# Altium footprint library IntLib.PcbLib: 221 footprints (part 14 of 14)
Each footprint in its own frame and in the unit in brackets; x right, y up, seen from the top. Pads: shape width x height; smd on the part's side, far side on the other; paste and mask are expansions set on the pad; w line width, h text height; cw(c..) or ccw(c..) is an arc to the next point about the centre after c.
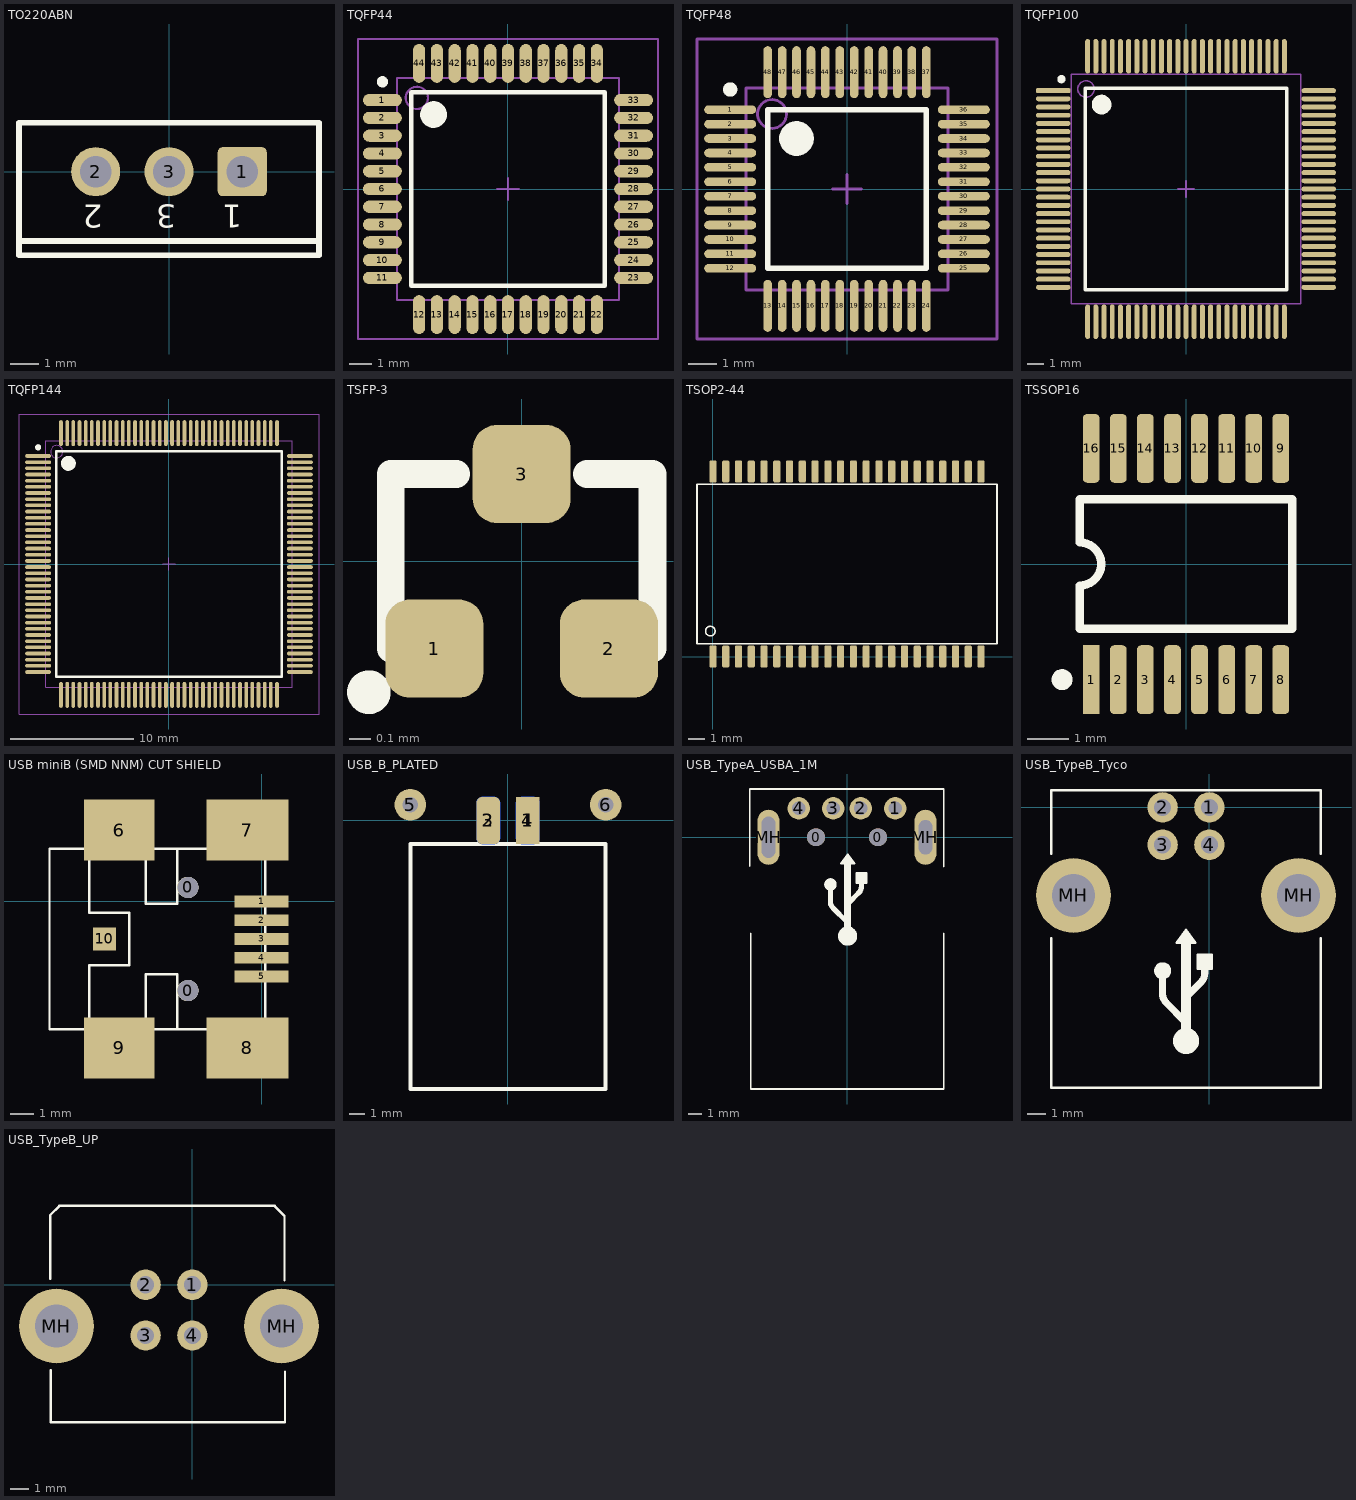
[diagram p13: the footprints below, top view; thin cyan lines are the x and y axes]

## TO220ABN [mm] "TO, Thru-Hole, Vertical, Heatsink Mounted; 3 In-Line Leads; Pitch 2.54 mm; Pin sequence 1, 3, 2"
height 19.7
pads (3):
  rrect20% 1.7x1.7 hole 1.1: 1(2.54,0)
  round 1.7 hole 1.1: 2(-2.54,0) 3(0,0)
Top Overlay:
  lines w0.2: -5.2,-2.4 5.2,-2.4 ; -5.2,-2.9 5.2,-2.9 5.2,1.7 -5.2,1.7 -5.2,-2.9
  text "3" at 0.246,-1.151 h0.8
  text "2" at -2.294,-1.151 h0.8
  text "1" at 2.536,-1.151 h0.8
3D body: height 18.74, standoff -10.04, extent -5.08,-2.921 5.08,1.651

## TQFP44 [mm] "44-Pin Plastic Thin Quad Flat Pack (TFQP44), IPC Medium Density"
height 1.2
pads (44):
  oval 1.75x0.55 smd: 1(-5.65,4) 2(-5.65,3.2) 3(-5.65,2.4) 4(-5.65,1.6) 5(-5.65,0.8) 6(-5.65,0) 7(-5.65,-0.8) 8(-5.65,-1.6) 9(-5.65,-2.4) 10(-5.65,-3.2) 11(-5.65,-4) 23(5.65,-4) 24(5.65,-3.2) 25(5.65,-2.4) 26(5.65,-1.6) 27(5.65,-0.8) 28(5.65,0) 29(5.65,0.8) 30(5.65,1.6) 31(5.65,2.4) 32(5.65,3.2) 33(5.65,4)
  oval 0.55x1.75 smd: 12(-4,-5.65) 13(-3.2,-5.65) 14(-2.4,-5.65) 15(-1.6,-5.65) 16(-0.8,-5.65) 17(0,-5.65) 18(0.8,-5.65) 19(1.6,-5.65) 20(2.4,-5.65) 21(3.2,-5.65) 22(4,-5.65) 34(4,5.65) 35(3.2,5.65) 36(2.4,5.65) 37(1.6,5.65) 38(0.8,5.65) 39(0,5.65) 40(-0.8,5.65) 41(-1.6,5.65) 42(-2.4,5.65) 43(-3.2,5.65) 44(-4,5.65)
Top Overlay:
  circle w0.25: c-5.65,4.825 r0.125
  circle w0.6: c-3.35,3.35 r0.3
  lines w0.2: -4.35,-4.35 -4.35,4.35 4.35,4.35 4.35,-4.35 -4.35,-4.35
Mechanical 13:
  circle w0.1: c-4.1,4.1 r0.5
  lines w0.1: -5,-5 -5,5 5,5 5,-5 -5,-5
Mechanical 15:
  lines w0.1: -0.5,0 0.5,0 ; 0,-0.5 0,0.5 ; -6.75,-6.75 -6.75,6.75 6.75,6.75 6.75,-6.75 -6.75,-6.75
3D body: height 1.2, standoff 0, extent -5,-5 5,5

## TQFP48 [mm] "48-Pin Thin Quad Flat Pack 0.5 mm Pitch, IPC Medium Density"
height 1.6
pads (48):
  oval 1.8x0.3 smd: 1(-4.05,2.75) 2(-4.05,2.25) 3(-4.05,1.75) 4(-4.05,1.25) 5(-4.05,0.75) 6(-4.05,0.25) 7(-4.05,-0.25) 8(-4.05,-0.75) 9(-4.05,-1.25) 10(-4.05,-1.75) 11(-4.05,-2.25) 12(-4.05,-2.75) 25(4.05,-2.75) 26(4.05,-2.25) 27(4.05,-1.75) 28(4.05,-1.25) 29(4.05,-0.75) 30(4.05,-0.25) 31(4.05,0.25) 32(4.05,0.75) 33(4.05,1.25) 34(4.05,1.75) 35(4.05,2.25) 36(4.05,2.75)
  oval 0.3x1.8 smd: 13(-2.75,-4.05) 14(-2.25,-4.05) 15(-1.75,-4.05) 16(-1.25,-4.05) 17(-0.75,-4.05) 18(-0.25,-4.05) 19(0.25,-4.05) 20(0.75,-4.05) 21(1.25,-4.05) 22(1.75,-4.05) 23(2.25,-4.05) 24(2.75,-4.05) 37(2.75,4.05) 38(2.25,4.05) 39(1.75,4.05) 40(1.25,4.05) 41(0.75,4.05) 42(0.25,4.05) 43(-0.25,4.05) 44(-0.75,4.05) 45(-1.25,4.05) 46(-1.75,4.05) 47(-2.25,4.05) 48(-2.75,4.05)
Top Overlay:
  circle w0.25: c-4.05,3.45 r0.125
  circle w0.6: c-1.75,1.75 r0.3
  lines w0.2: -2.75,-2.75 -2.75,2.75 2.75,2.75 2.75,-2.75 -2.75,-2.75
Mechanical 13:
  circle w0.1: c-2.6,2.6 r0.5
  lines w0.1: -3.5,-3.5 -3.5,3.5 3.5,3.5 3.5,-3.5 -3.5,-3.5
Mechanical 15:
  lines w0.1: -0.5,0 0.5,0 ; 0,-0.5 0,0.5 ; -5.2,-5.2 -5.2,5.2 5.2,5.2 5.2,-5.2 -5.2,-5.2
3D body: height 1.6, standoff 0, extent -3.5,-3.5 3.5,3.5

## TQFP100 [mm] "100-Pin Thin Quad Flat Pack 0.5 mm Pitch, IPC Low Density"
height 1.6
pads (100):
  rrect50% 2.1x0.3 smd: 1(-8.1,6)
  oval 2.1x0.3 smd: 2(-8.1,5.5) 3(-8.1,5) 4(-8.1,4.5) 5(-8.1,4) 6(-8.1,3.5) 7(-8.1,3) 8(-8.1,2.5) 9(-8.1,2) 10(-8.1,1.5) 11(-8.1,1) 12(-8.1,0.5) 13(-8.1,0) 14(-8.1,-0.5) 15(-8.1,-1) 16(-8.1,-1.5) 17(-8.1,-2) 18(-8.1,-2.5) 19(-8.1,-3) 20(-8.1,-3.5) 21(-8.1,-4) 22(-8.1,-4.5) 23(-8.1,-5) 24(-8.1,-5.5) 25(-8.1,-6) 51(8.1,-6) 52(8.1,-5.5) 53(8.1,-5) 54(8.1,-4.5) 55(8.1,-4) 56(8.1,-3.5) 57(8.1,-3) 58(8.1,-2.5) 59(8.1,-2) 60(8.1,-1.5) 61(8.1,-1) 62(8.1,-0.5) 63(8.1,0) 64(8.1,0.5) 65(8.1,1) 66(8.1,1.5) 67(8.1,2) 68(8.1,2.5) 69(8.1,3) 70(8.1,3.5) 71(8.1,4) 72(8.1,4.5) 73(8.1,5) 74(8.1,5.5) 75(8.1,6)
  oval 0.3x2.1 smd: 26(-6,-8.1) 27(-5.5,-8.1) 28(-5,-8.1) 29(-4.5,-8.1) 30(-4,-8.1) 31(-3.5,-8.1) 32(-3,-8.1) 33(-2.5,-8.1) 34(-2,-8.1) 35(-1.5,-8.1) 36(-1,-8.1) 37(-0.5,-8.1) 38(0,-8.1) 39(0.5,-8.1) 40(1,-8.1) 41(1.5,-8.1) 42(2,-8.1) 43(2.5,-8.1) 44(3,-8.1) 45(3.5,-8.1) 46(4,-8.1) 47(4.5,-8.1) 48(5,-8.1) 49(5.5,-8.1) 50(6,-8.1) 76(6,8.1) 77(5.5,8.1) 78(5,8.1) 79(4.5,8.1) 80(4,8.1) 81(3.5,8.1) 82(3,8.1) 83(2.5,8.1) 84(2,8.1) 85(1.5,8.1) 86(1,8.1) 87(0.5,8.1) 88(0,8.1) 89(-0.5,8.1) 90(-1,8.1) 91(-1.5,8.1) 92(-2,8.1) 93(-2.5,8.1) 94(-3,8.1) 95(-3.5,8.1) 96(-4,8.1) 97(-4.5,8.1) 98(-5,8.1) 99(-5.5,8.1) 100(-6,8.1)
Top Overlay:
  circle w0.25: c-7.6,6.7 r0.125
  circle w0.6: c-5.15,5.15 r0.3
  lines w0.2: -6.15,-6.15 -6.15,6.15 6.15,6.15 6.15,-6.15 -6.15,-6.15
Mechanical 13:
  circle w0.1: c-6.1,6.1 r0.5
  lines w0.1: -7,-7 -7,7 7,7 7,-7 -7,-7
Mechanical 15:
  lines w0.1: -0.5,0 0.5,0 ; 0,-0.5 0,0.5
3D body: height 1.61, standoff -0.01, extent -8.001,-7.999 7.999,8.001

## TQFP144 [mm] "144-Pin Plastic Thin Quad Flat Pack (TQFP144), IPC Low Density"
height 1.6
pads (144):
  oval 2.1x0.3 smd: 1(-10.6,8.75) 2(-10.6,8.25) 3(-10.6,7.75) 4(-10.6,7.25) 5(-10.6,6.75) 6(-10.6,6.25) 7(-10.6,5.75) 8(-10.6,5.25) 9(-10.6,4.75) 10(-10.6,4.25) 11(-10.6,3.75) 12(-10.6,3.25) 13(-10.6,2.75) 14(-10.6,2.25) 15(-10.6,1.75) 16(-10.6,1.25) 17(-10.6,0.75) 18(-10.6,0.25) 19(-10.6,-0.25) 20(-10.6,-0.75) 21(-10.6,-1.25) 22(-10.6,-1.75) 23(-10.6,-2.25) 24(-10.6,-2.75) 25(-10.6,-3.25) 26(-10.6,-3.75) 27(-10.6,-4.25) 28(-10.6,-4.75) 29(-10.6,-5.25) 30(-10.6,-5.75) 31(-10.6,-6.25) 32(-10.6,-6.75) 33(-10.6,-7.25) 34(-10.6,-7.75) 35(-10.6,-8.25) 36(-10.6,-8.75) 73(10.6,-8.75) 74(10.6,-8.25) 75(10.6,-7.75) 76(10.6,-7.25) 77(10.6,-6.75) 78(10.6,-6.25) 79(10.6,-5.75) 80(10.6,-5.25) 81(10.6,-4.75) 82(10.6,-4.25) 83(10.6,-3.75) 84(10.6,-3.25) 85(10.6,-2.75) 86(10.6,-2.25) 87(10.6,-1.75) 88(10.6,-1.25) 89(10.6,-0.75) 90(10.6,-0.25) 91(10.6,0.25) 92(10.6,0.75) 93(10.6,1.25) 94(10.6,1.75) 95(10.6,2.25) 96(10.6,2.75) 97(10.6,3.25) 98(10.6,3.75) 99(10.6,4.25) 100(10.6,4.75) 101(10.6,5.25) 102(10.6,5.75) 103(10.6,6.25) 104(10.6,6.75) 105(10.6,7.25) 106(10.6,7.75) 107(10.6,8.25) 108(10.6,8.75)
  oval 0.3x2.1 smd: 37(-8.75,-10.6) 38(-8.25,-10.6) 39(-7.75,-10.6) 40(-7.25,-10.6) 41(-6.75,-10.6) 42(-6.25,-10.6) 43(-5.75,-10.6) 44(-5.25,-10.6) 45(-4.75,-10.6) 46(-4.25,-10.6) 47(-3.75,-10.6) 48(-3.25,-10.6) 49(-2.75,-10.6) 50(-2.25,-10.6) 51(-1.75,-10.6) 52(-1.25,-10.6) 53(-0.75,-10.6) 54(-0.25,-10.6) 55(0.25,-10.6) 56(0.75,-10.6) 57(1.25,-10.6) 58(1.75,-10.6) 59(2.25,-10.6) 60(2.75,-10.6) 61(3.25,-10.6) 62(3.75,-10.6) 63(4.25,-10.6) 64(4.75,-10.6) 65(5.25,-10.6) 66(5.75,-10.6) 67(6.25,-10.6) 68(6.75,-10.6) 69(7.25,-10.6) 70(7.75,-10.6) 71(8.25,-10.6) 72(8.75,-10.6) 109(8.75,10.6) 110(8.25,10.6) 111(7.75,10.6) 112(7.25,10.6) 113(6.75,10.6) 114(6.25,10.6) 115(5.75,10.6) 116(5.25,10.6) 117(4.75,10.6) 118(4.25,10.6) 119(3.75,10.6) 120(3.25,10.6) 121(2.75,10.6) 122(2.25,10.6) 123(1.75,10.6) 124(1.25,10.6) 125(0.75,10.6) 126(0.25,10.6) 127(-0.25,10.6) 128(-0.75,10.6) 129(-1.25,10.6) 130(-1.75,10.6) 131(-2.25,10.6) 132(-2.75,10.6) 133(-3.25,10.6) 134(-3.75,10.6) 135(-4.25,10.6) 136(-4.75,10.6) 137(-5.25,10.6) 138(-5.75,10.6) 139(-6.25,10.6) 140(-6.75,10.6) 141(-7.25,10.6) 142(-7.75,10.6) 143(-8.25,10.6) 144(-8.75,10.6)
Top Overlay:
  circle w0.6: c-8.15,8.15 r0.3
  circle w0.25: c-10.6,9.45 r0.125
  lines w0.2: -9.15,-9.15 9.15,-9.15 9.15,9.15 -9.15,9.15 -9.15,-9.15
Mechanical 13:
  circle w0.1: c-9.1,9.1 r0.5
  lines w0.1: -10,-10 10,-10 10,10 -10,10 -10,-10
Mechanical 15:
  lines w0.1: -0.5,0 0.5,0 ; 0,-0.5 0,0.5 ; -12.15,-12.15 12.15,-12.15 12.15,12.15 -12.15,12.15 -12.15,-12.15
3D body: height 1.6, standoff 0, extent -10,-10 10,10

## TSFP-3 [mm] "1.2x1.2mm"
height 1
pads (3):
  rrect50% 0.45x0.45 smd: 1(-0.4,-0.4) 2(0.4,-0.4) 3(0,0.4)
Top Overlay:
  circle w0.1: c-0.7,-0.6 r0.05
  lines w0.127: -0.6,-0.4 -0.6,0.4 -0.3,0.4 ; 0.3,0.4 0.6,0.4 0.6,-0.4

## TSOP2-44 [mm]
pads (44):
  rrect50% 0.45x1.4 smd paste-25.4 mask-25.4: 1(0,0) 2(0.8,0) 3(1.6,0) 4(2.4,0) 5(3.2,0) 6(4,0) 7(4.8,0) 8(5.6,0) 9(6.4,0) 10(7.2,0) 11(8,0) 12(8.8,0) 13(9.6,0) 14(10.4,0) 15(11.2,0) 16(12,0) 17(12.8,0) 18(13.6,0) 19(14.4,0) 20(15.2,0) 21(16,0) 22(16.8,0) 23(16.8,11.6) 24(16,11.6) 25(15.2,11.6) 26(14.4,11.6) 27(13.6,11.6) 28(12.8,11.6) 29(12,11.6) 30(11.2,11.6) 31(10.4,11.6) 32(9.6,11.6) 33(8.8,11.6) 34(8,11.6) 35(7.2,11.6) 36(6.4,11.6) 37(5.6,11.6) 38(4.8,11.6) 39(4,11.6) 40(3.2,11.6) 41(2.4,11.6) 42(1.6,11.6) 43(0.8,11.6) 44(0,11.6)
Top Overlay:
  circle w0.1: c-0.165,1.595 r0.3
  lines w0.1: -1,0.8 -1,10.8 17.8,10.8 17.8,0.8 -1,0.8
Top Paste:
  drawing of 44 lines, arcs and shapes, not listed
Top Solder:
  drawing of 44 lines, arcs and shapes, not listed
3D body: height 1.3, standoff -0.09, extent -0.686,-0.076 17.524,11.684

## TSSOP16 [mm] "Shrink Small Outline; 16 Leads; Body Width 4.4 mm; Pitch 0.65 mm"
height 1.1
pads (16):
  rect 0.4x1.65 smd: 1(-2.275,-2.775)
  rrect50% 0.4x1.65 smd: 2(-1.625,-2.775) 3(-0.975,-2.775) 4(-0.325,-2.775) 5(0.325,-2.775) 6(0.975,-2.775) 7(1.625,-2.775) 8(2.275,-2.775) 9(2.275,2.775) 10(1.625,2.775) 11(0.975,2.775) 12(0.325,2.775) 13(-0.325,2.775) 14(-0.975,2.775) 15(-1.625,2.775) 16(-2.275,2.775)
Top Overlay:
  circle w0.25: c-2.975,-2.775 r0.125
  lines w0.2: -2.55,-1.55 -2.55,-0.517 ccw(c-2.55,0) -2.55,0.517 -2.55,1.55 2.55,1.55 2.55,-1.55 -2.55,-1.55
3D body: height 1.2, standoff 0, extent -2.489,-3.175 2.511,3.225

## USB miniB (SMD NNM) CUT SHIELD [mm]
height 2
pads (12):
  round 0.9 hole 0.9 unplated: 0(-3.145,-3.8) 0(-3.145,0.6)
  rect 2.3x0.5 smd: 1(0,0) 2(0,-0.8) 3(0,-1.6) 4(0,-2.4) 5(0,-3.2)
  rect 3x2.6 smd: 6(-6.075,3.05) 9(-6.075,-6.25)
  rect 3.5x2.6 smd: 7(-0.6,3.05) 8(-0.6,-6.25)
  rect 1x1 smd: 10(-6.7,-1.6)
Top Overlay:
  circle w0.1: c-3.145,-3.8 r0.4
  circle w0.1: c-3.145,0.6 r0.4
  lines w0.1: -7.345,-5.45 -7.345,-2.72 -5.645,-2.72 -5.645,-0.48 -7.345,-0.48 -7.345,2.25 ; -6.845,-5.45 -6.845,-6.55 -5.295,-6.55 -5.295,-5.45 ; -6.845,2.25 -6.845,3.35 -5.295,3.35 -5.295,2.25 ; -4.945,-5.45 -4.945,-3.1 -3.595,-3.1 -3.595,-5.45 ; -4.945,2.25 -4.945,-0.1 -3.595,-0.1 -3.595,2.25 ; -1.395,-5.45 -1.395,-6.55 0.155,-6.55 ; -1.395,2.25 -1.395,3.35 0.155,3.35 ; -1.345,-6.55 0.155,-6.55 ; -1.345,3.35 0.155,3.35 ; 0.155,-6.55 0.155,-5.45 ; 0.155,-5.45 0.155,2.25 ; 0.155,-5.45 -9.045,-5.45 -9.045,2.25 0.155,2.25 ; 0.155,2.25 0.155,3.35
3D body: height 3.9, standoff -1.1, extent -8.989,-6.525 0.406,3.375

## USB_B_PLATED [mm]
pads (6):
  rect 1.5x3 smd: 1(1.25,0)
  rrect50% 1.5x3 smd: 2(-1.25,0)
  rrect50% 1.5x3 smd far side: 3(-1.25,0) 4(1.25,0)
  round 2 / inner rrect50% 2.2x5 / far side rrect50% 2.2x5 hole 1: 5(-6.2,1) 6(6.2,1)
Top Overlay:
  lines w0.254: -6.2,-17.05 -6.2,-1.5 6.2,-1.5 6.2,-17.05 -6.2,-17.05
3D body: height 5, standoff -6, extent -7.494,-17.721 7.545,3.429

## USB_TypeA_USBA_1M [mm]
pads (8):
  round 1.3 hole 1.3 unplated: 0(-2.25,0) 0(2.25,0)
  round 1.626 hole 1: 1(3.5,2.1) 2(1,2.1) 3(-1,2.1) 4(-3.5,2.1)
  oval 1.6x4 hole 1 slot 3 at 90 deg: MH(-5.7,0)
  oval 1.6x4 hole 1 slot 2.5 at 90 deg: MH(5.7,0)
Top Overlay:
  circle w0.508: c-1.205,-3.431 r0.2
  circle w0.889: c0.045,-7.181 r0.254
  region: 1.42,-2.581 1.42,-3.331 0.67,-3.331 0.67,-2.581
  region: 0.045,-1.231 0.545,-1.931 -0.455,-1.931
  lines w0.127: -7.061,-2.083 -7.061,3.505 7.036,3.505 7.036,-2.134 ; -6.985,-6.99 -6.985,-18.288 7.036,-18.288 7.036,-6.99 ; -0.455,-1.931 0.545,-1.931 0.045,-1.231 -0.455,-1.931 ; 0.67,-3.331 1.42,-3.331 1.42,-2.581 0.67,-2.581 0.67,-3.331
  lines w0.381: -1.205,-3.431 -1.205,-4.681 ccw(c-0.564,-4.681) -1.017,-5.134 -0.017,-6.134 ; 0.108,-4.784 0.858,-4.034 ccw(c0.405,-3.581) 1.045,-3.581 1.045,-3.331
  lines w0.508: 0.045,-6.681 0.045,-1.931
3D body: height 4.5, standoff -1.3, extent -6.278,-17.664 6.328,2.261

## USB_TypeB_Tyco [mm]
pads (6):
  round 1.626 hole 0.914: 1(0,0) 2(-2.5,0) 3(-2.5,-2) 4(0,-2)
  round 4 hole 2.3: MH(-7.27,-4.71) MH(4.77,-4.71)
Top Overlay:
  circle w0.889: c-1.25,-12.49 r0.254
  circle w0.508: c-2.5,-8.74 r0.2
  region: -1.25,-6.54 -0.75,-7.24 -1.75,-7.24
  region: 0.125,-7.89 0.125,-8.64 -0.625,-8.64 -0.625,-7.89
  lines w0.127: -8.45,-6.99 -8.45,-14.99 5.95,-14.99 5.95,-6.99 ; -8.45,-2.49 -8.45,0.91 5.95,0.91 5.95,-2.49 ; -1.75,-7.24 -1.25,-6.54 -0.75,-7.24 -1.75,-7.24 ; -0.625,-8.64 -0.625,-7.89 0.125,-7.89 0.125,-8.64 -0.625,-8.64
  lines w0.381: -2.5,-8.74 -2.5,-9.99 ccw(c-1.86,-9.99) -2.312,-10.443 -1.312,-11.443 ; -1.188,-10.093 -0.438,-9.343 ccw(c-0.89,-8.89) -0.25,-8.89 -0.25,-8.64
  lines w0.508: -1.25,-11.99 -1.25,-7.24
3D body: height 11.5, standoff -3.93, extent -8.444,-14.99 5.944,0.71

## USB_TypeB_UP [mm]
pads (6):
  round 1.626 hole 0.914: 1(0,0) 2(-2.5,0) 3(-2.5,-2.71) 4(0,-2.71)
  round 4 hole 2.3: MH(-7.27,-2.205) MH(4.77,-2.205)
Top Overlay:
  lines w0.127: -7.595,0.33 -7.595,3.734 -7.112,4.216 4.394,4.216 4.928,3.683 4.928,0.229 ; -7.569,-4.572 -7.569,-7.341 4.953,-7.341 4.953,-4.648
3D body: height 17, standoff -4.15, extent -8.815,-6.987 6.224,4.013